# Altium footprint library Selex_PCBLib.PcbLib: 388 footprints (part 8 of 25)
Each footprint in its own frame and in the unit in brackets; x right, y up, seen from the top. Pads: shape width x height; smd on the part's side, far side on the other; paste and mask are expansions set on the pad; w line width, h text height; cw(c..) or ccw(c..) is an arc to the next point about the centre after c.
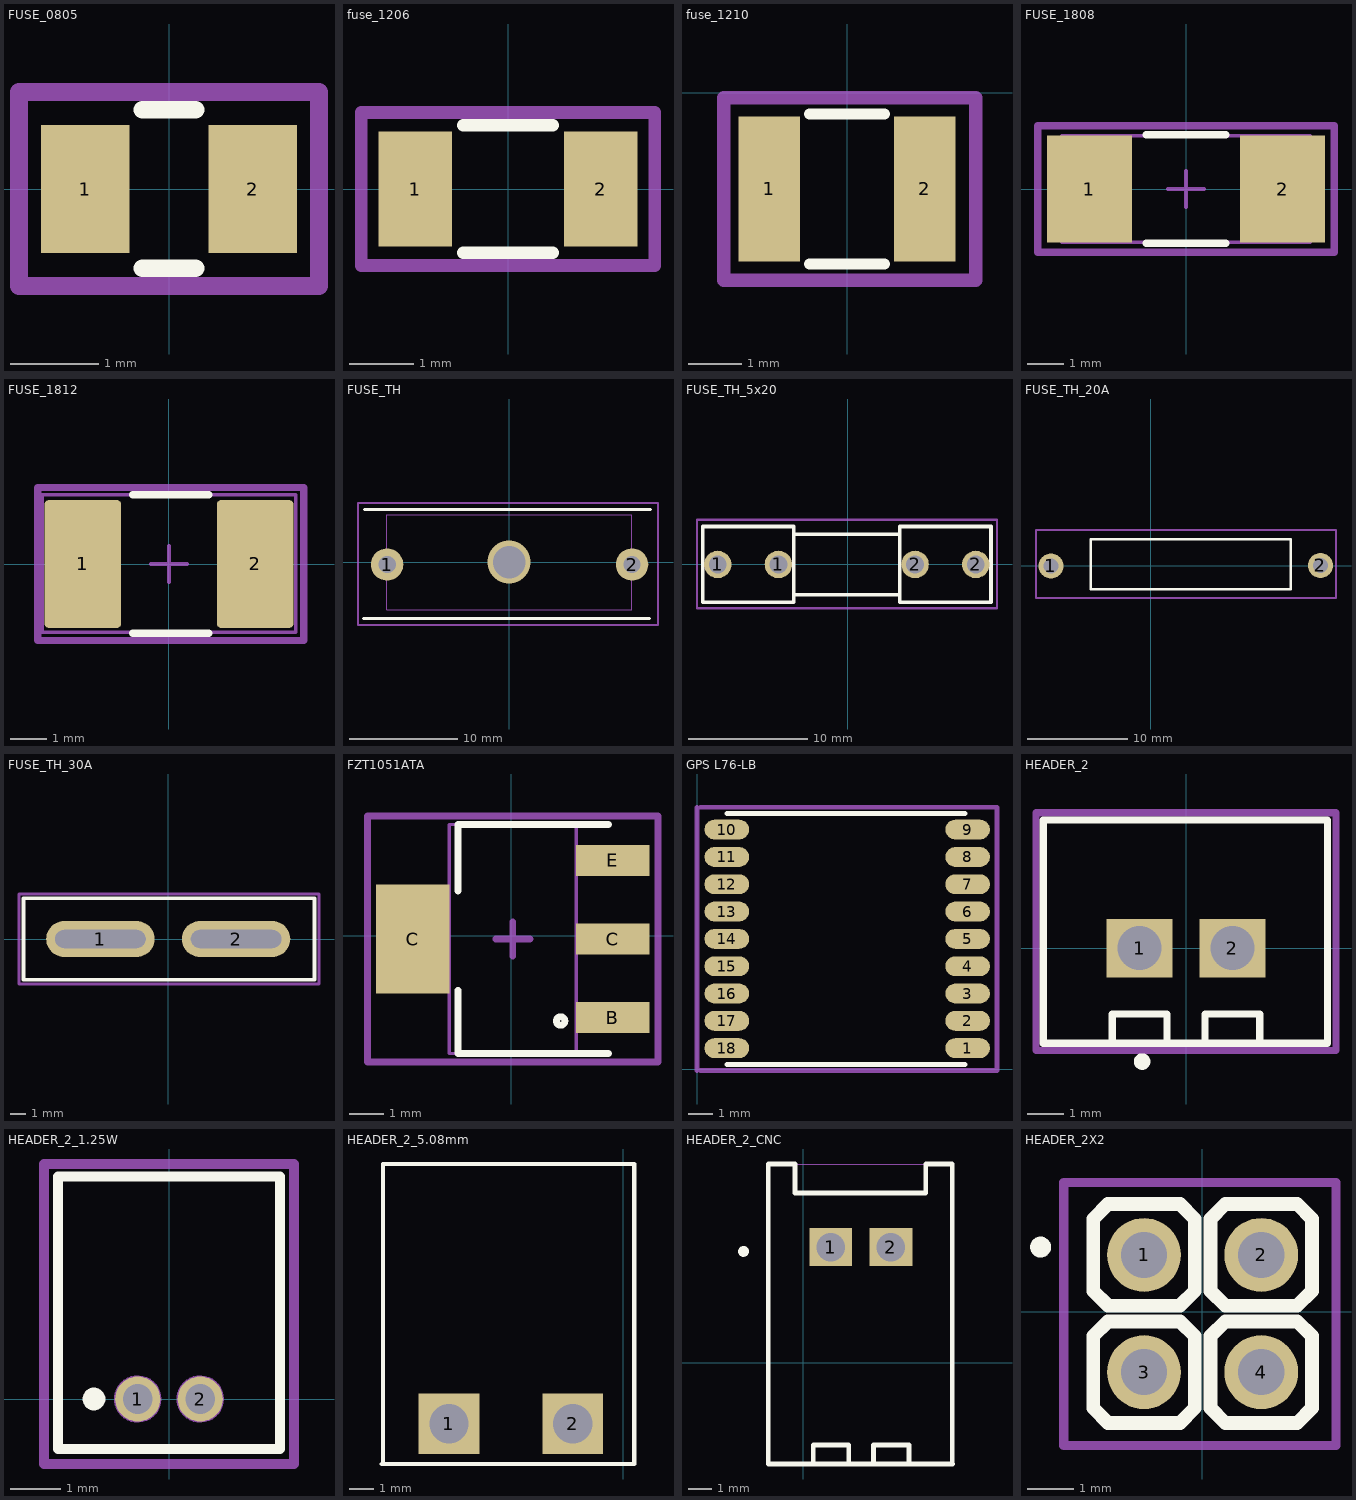
[diagram p7: the footprints below, top view; thin cyan lines are the x and y axes]

## FUSE_0805 [mm]
pads (2):
  rect 1x1.45 smd: 1(-0.95,0) 2(0.95,0)
Top Overlay:
  lines w0.2: -0.3,-0.9 0.3,-0.9 ; -0.3,0.9 0.3,0.9
Mechanical 15:
  lines w0.2: -1.7,-1.1 -1.7,1.1 1.7,1.1 1.7,-1.1 -1.7,-1.1
3D body "fuse_silicon_0805L.step": height 0.5, standoff 0, extent -1.1,-0.77 1.1,0.77

## fuse_1206 [mm]
pads (2):
  rect 1.15x1.8 smd: 1(-1.45,0) 2(1.45,0)
Top Overlay:
  lines w0.2: -0.7,-1 0.7,-1 ; -0.7,1 0.7,1
Mechanical 15:
  lines w0.2: -2.3,-1.2 2.3,-1.2 2.3,1.2 -2.3,1.2 -2.3,-1.2
3D body "fuse_silicon_1206L.step": height 0.5, standoff 0, extent -1.75,-0.92 1.75,0.92

## fuse_1210 [mm]
pads (2):
  rect 1.15x2.7 smd: 1(-1.45,-1.8) 2(1.45,-1.8)
Top Overlay:
  lines w0.2: -0.7,-3.2 -0.35,-3.2 0.35,-3.2 0.7,-3.2 ; -0.7,-0.4 -0.35,-0.4 0.35,-0.4 0.7,-0.4
Mechanical 15:
  lines w0.254: -2.3,-3.5 2.4,-3.5 2.4,-0.1 -2.3,-0.1 -2.3,-3.5
3D body "fuse_silicon_1206L.step": height 0.5, standoff 0, extent -1.75,-2.72 1.75,-0.88
3D body "User Library-0ZCH0010FF2E.STEP": height 0.71, standoff 0.01, extent -1.7,-3.1 1.7,-0.5

## FUSE_1808 [mm]
pads (2):
  rect 2.35x2.95 smd: 1(-2.675,0) 2(2.675,0)
Top Overlay:
  lines w0.2: -1.1,-1.5 1.1,-1.5 ; -1.1,1.5 1.1,1.5
Mechanical 13:
  lines w0.1: -3.43,-1.47 3.43,-1.47 3.43,1.47 -3.43,1.47 -3.43,-1.47
Mechanical 15:
  lines w0.1: -0.5,0 0.5,0 ; 0,-0.5 0,0.5
  lines w0.2: -4.1,-1.75 4.1,-1.75 4.1,1.75 -4.1,1.75 -4.1,-1.75
3D body: height 0.8, standoff 0, extent 1.47,-1.47 3.43,1.47
3D body: height 0.8, standoff 0, extent -3.43,-1.47 -1.47,1.47
3D body: height 0.8, standoff 0, extent -1.47,-1.47 1.47,1.47

## FUSE_1812 [mm]
pads (2):
  rrect10% 2.1x3.5 smd: 1(-2.365,0) 2(2.365,0)
Top Overlay:
  lines w0.2: -1,-1.9 1.1,-1.9 ; -1,1.9 1.1,1.9
Mechanical 13:
  lines w0.1: -3.475,-1.875 -3.475,1.9 3.475,1.9 3.475,-1.875 -3.475,-1.875
Mechanical 15:
  lines w0.1: -0.5,0 0.5,0 ; 0,-0.5 0,0.5
  lines w0.2: -3.6,-2.1 -3.6,2.1 3.7,2.1 3.7,-2.1 -3.6,-2.1
3D body "User Library-1812L.step": height 1.34, standoff 0, extent -2.365,-1.705 2.365,1.705

## FUSE_TH [mm]
pads (2):
  round 3 hole 1.6 mask+0.1: 1(-11.3,-0.2) 2(11.4,-0.2)
via 0,0.02 diameter 4 hole 3
Top Overlay:
  lines w0.3: -13.5,-5.2 13,-5.2 ; -13.4,4.9 13.1,4.9
Mechanical 1:
  lines w0.05: -11.35,-4.38 11.35,-4.38 11.35,4.42 -11.35,4.42 -11.35,-4.38
Mechanical 15:
  lines w0.2: -14,-5.8 -14,5.5 13.8,5.5 13.8,-5.8 -2.4,-5.8 -14,-5.8
3D body "696107003002.STEP": height 14, standoff -3, extent -12.2,-4.88 12.2,4.52

## FUSE_TH_5x20 [mm]
pads (4):
  round 2.3 hole 1.5 mask+0.1: 1(-10.865,-0.04) 1(-5.785,-0.04) 2(5.645,-0.04) 2(10.725,-0.04)
Top Overlay:
  lines w0.3: -4.515,-2.58 4.375,-2.58 ; -4.515,2.5 4.375,2.5 ; -12.135,-3.215 -12.135,3.135 -4.515,3.135 -4.515,-3.215 -12.135,-3.215 ; 4.375,-3.215 11.995,-3.215 11.995,3.135 4.375,3.135 4.375,-3.215
Mechanical 1:
  circle w0.05: c-10.865,-0.04 r1
  circle w0.05: c-5.785,-0.04 r1
  circle w0.05: c5.645,-0.04 r1
  circle w0.05: c10.725,-0.04 r1
  lines w0.05: -4.515,-2.58 4.375,-2.58 ; -4.515,2.5 4.375,2.5 ; -12.135,-3.215 -4.515,-3.215 -4.515,3.135 -12.135,3.135 -12.135,-3.215 ; 4.375,-3.215 4.375,3.135 11.995,3.135 11.995,-3.215 4.375,-3.215
Mechanical 15:
  lines w0.2: -12.6,-3.7 -12.6,3.7 12.5,3.7 12.5,-3.7 -12.6,-3.7
3D body "SW3dPS-Fuse Leg_2009.STEP": height 9.6, standoff -3.3, extent 5.237,-3.11 11.333,3.08
3D body "SW3dPS-Fuse Small 1A.STEP": height 9.41, standoff 4.31, extent -10.02,-2.59 9.68,2.51
3D body "SW3dPS-Fuse Leg_2009.STEP": height 9.6, standoff -3.3, extent -11.263,-3.21 -5.167,2.98

## FUSE_TH_20A [mm]
pads (2):
  round 2.5 hole 1.5 paste+0.1: 1(-10,0) 2(16.942,0.051)
Top Overlay:
  lines w0.254: -6.038,-2.348 -6.038,2.652 13.962,2.652 13.962,-2.348 -6.038,-2.348
Mechanical 15:
  lines w0.2: -11.5,-3.2 -11.5,3.6 18.5,3.6 18.5,-3.2 -11.5,-3.2
3D body "User Library-Fuse 5x20mm 27mm pitch.STEP": height 6.1, standoff -3.7, extent -10.454,-2.923 17.196,3.277

## FUSE_TH_30A [mm]
pads (2):
  oval 7.2x2.4 hole 1.2 slot 6 at 0 deg: 1(-4.5,0) 2(4.5,0)
Top Overlay:
  lines w0.254: -9.6,-2.7 9.7,-2.7 9.7,2.7 -9.6,2.7 -9.6,-2.7
Mechanical 15:
  lines w0.2: -9.9,-3 -9.9,3 10,3 10,-3 -9.9,-3
3D body "User Library-blade fuse - 1 to 40 a - 32 v.STEP": height 14.29, standoff -4.51, extent -9.652,-2.54 9.398,2.54

## FZT1051ATA [mm]
pads (4):
  rect 2.15x0.9 smd: B(2.98,-2.4) C(2.98,-0.1) E(2.98,2.2)
  rect 2.15x3.2 smd: C(-2.88,-0.1)
Top Overlay:
  circle w0.2: c1.45,-2.5 r0.125
  lines w0.2: -1.55,-1.6 -1.55,-3.45 2.855,-3.45 ; -1.55,1.3 -1.55,3.25 2.85,3.25
Mechanical 13:
  lines w0.1: -1.805,-3.45 1.905,-3.45 1.905,3.25 -1.805,3.25 -1.805,-3.45
Mechanical 15:
  lines w0.2: -0.45,-0.1 0.55,-0.1 ; 0.05,-0.6 0.05,0.4 ; -4.2,-3.7 4.3,-3.7 4.3,3.5 -4.2,3.5 -4.2,-3.7
3D body "SOT230P700X180-4N.step": height 1.8, standoff 0, extent -3.55,-3.45 3.45,3.25

## GPS L76-LB [mm]
pads (18):
  rrect100% 1.8x0.8 smd: 1(10.9,0.85) 2(10.9,1.95) 3(10.9,3.05) 4(10.9,4.15) 5(10.9,5.25) 6(10.9,6.35) 7(10.9,7.45) 8(10.9,8.55) 9(10.9,9.65) 10(1.2,9.65) 11(1.2,8.55) 12(1.2,7.45) 13(1.2,6.35) 14(1.2,5.25) 15(1.2,4.15) 16(1.2,3.05) 17(1.2,1.95) 18(1.2,0.85)
Top Overlay:
  lines w0.2: 1.2,0.2 10.8,0.2 ; 1.2,10.3 10.79,10.3
Mechanical 15:
  lines w0.2: 0,-0.06 0,9.99 0,10.54 ; 0.15,-0.05 12.08,-0.05 12.08,10.55 0.15,10.55
3D body "User Library-QUECTEL L76.STEP": height 2.52, standoff 0, extent 1.15,0.1 10.85,10.2

## HEADER_2 [mm] "HEADER_2_2P54"
pads (2):
  rect 1.8x1.6 hole 1.2 mask+0.1: 1(-1.27,0) 2(1.27,0)
Top Overlay:
  circle w0.254: c-1.2,-3.1 r0.1
  lines w0.2: -2.02,-2.5 -2.02,-1.8 -0.52,-1.8 -0.52,-2.5 ; 0.52,-2.5 0.52,-1.8 2.02,-1.8 2.02,-2.5 ; -3.9,-2.596 -3.9,3.504 3.87,3.504 3.87,-2.596 -3.9,-2.596
Mechanical 1:
  circle w0.05: c1.27,0 r0.762
  circle w0.05: c-1.27,0 r0.762
  lines w0.05: -2.02,-2.596 -2.02,-1.8 -0.52,-1.8 -0.52,-2.596 ; 0.52,-2.596 0.52,-1.8 2.02,-1.8 2.02,-2.596 ; -3.91,-2.596 -3.91,3.504 3.87,3.504 3.87,-2.596 -3.91,-2.596
  text "1" at -1.43,-0.4 h0.8
  text "2" at 0.97,-0.4 h0.8
Mechanical 15:
  lines w0.2: -4.1,-2.8 -4.1,3.7 4.1,3.7 4.1,3.1 4.1,-2.8 -4.1,-2.8
3D body "B2B-XH-A-LF--SN---3DModel-STEP-418109.STEP": height 7, standoff -3.4, extent -3.7,-2.45 3.7,3.3

## HEADER_2_1.25W [mm] "HEADER_2_1.25AW"
pads (2):
  round 0.9 hole 0.6 mask+0.05: 1(-0.625,0) 2(0.625,0)
Top Overlay:
  circle w0.254: c-1.5,0 r0.1
  lines w0.2: -2.225,-1 2.225,-1 2.225,4.45 -2.225,4.45 -2.225,-1
Mechanical 1:
  circle w0.05: c-0.625,0 r0.45
  circle w0.05: c0.625,0 r0.45
  lines w0.05: -2.225,-1 -2.225,4.5 2.225,4.5 2.225,-1 -2.225,-1
Mechanical 15:
  lines w0.2: -2.5,-1.3 2.5,-1.3 2.5,4.7 -2.5,4.7 -2.5,-1.3
3D body "31729.stp": height 4.18, standoff -1.72, extent -2.1,-1 2.05,4.4

## HEADER_2_5.08mm [mm]
pads (2):
  rect 2.5x2.5 hole 1.6: 1(-7.15,7.9) 2(-2.07,7.9)
Top Overlay:
  lines w0.167: -9.9,6.25 0.45,6.25 0.45,18.55 -9.85,18.55 -9.85,6.3 -9.9,6.25
3D body "User Library-2EDGR-5_08-02P.STEP": height 9.1, standoff -3.1, extent -9.78,6.4 0.38,18.5

## HEADER_2_CNC [mm]
pads (2):
  rect 1.8x1.6 hole 1.2 mask+0.1: 1(1.155,4.867) 2(3.695,4.867)
Top Overlay:
  circle w0.254: c-2.52,4.686 r0.1
  lines w0.2: -1.464,-4.273 6.306,-4.273 ; 0.416,-4.177 0.416,-3.477 1.916,-3.477 1.916,-4.177 ; 2.956,-4.177 2.956,-3.477 4.456,-3.477 4.456,-4.177 ; -1.475,-4.276 -1.475,8.371 -0.351,8.371 -0.351,7.149 5.159,7.149 5.159,8.371 6.283,8.371 6.283,-4.276 -1.475,-4.276
Mechanical 1:
  circle w0.05: c3.695,4.867 r0.762
  circle w0.05: c1.155,4.867 r0.762
  lines w0.05: -1.485,2.271 -1.485,8.371 6.295,8.371 6.295,2.271 ; -1.474,-4.273 6.306,-4.273 ; 0.416,-4.273 0.416,-3.477 1.916,-3.477 1.916,-4.273 ; 2.956,-4.273 2.956,-3.477 4.456,-3.477 4.456,-4.273
  text "1" at 0.995,4.467 h0.8
  text "2" at 3.395,4.467 h0.8

## HEADER_2X2 [mm] "2X2_2P54"
pads (4):
  round 1.6 hole 1 mask+0.1: 1(-1.26,1.23) 2(1.28,1.23) 3(-1.26,-1.31) 4(1.28,-1.31)
Top Overlay:
  circle w0.254: c-3.5,1.4 r0.1
  lines w0.3: -2.36,-2.09 -2.04,-2.41 -0.48,-2.41 -0.16,-2.09 -0.16,-0.53 -0.48,-0.21 -2.04,-0.21 -2.36,-0.53 -2.36,-2.09 ; -2.36,0.45 -2.04,0.13 -0.48,0.13 -0.16,0.45 -0.16,2.01 -0.48,2.33 -2.04,2.33 -2.36,2.01 -2.36,0.45 ; 0.18,-2.09 0.5,-2.41 2.06,-2.41 2.38,-2.09 2.38,-0.53 2.06,-0.21 0.5,-0.21 0.18,-0.53 0.18,-2.09 ; 0.18,0.45 0.5,0.13 2.06,0.13 2.38,0.45 2.38,2.01 2.06,2.33 0.5,2.33 0.18,2.01 0.18,0.45
Mechanical 1:
  circle w0.05: c1.28,-1.31 r0.762
  circle w0.05: c-1.26,-1.31 r0.762
  circle w0.05: c1.28,1.23 r0.762
  circle w0.05: c-1.26,1.23 r0.762
  lines w0.05: -2.36,-2.09 -2.36,-0.53 -2.04,-0.21 -0.48,-0.21 -0.16,-0.53 -0.16,-2.09 -0.48,-2.41 -2.04,-2.41 -2.36,-2.09 ; -2.36,0.45 -2.36,2.01 -2.04,2.33 -0.48,2.33 -0.16,2.01 -0.16,0.45 -0.48,0.13 -2.04,0.13 -2.36,0.45 ; 0.18,-2.09 0.18,-0.53 0.5,-0.21 2.06,-0.21 2.38,-0.53 2.38,-2.09 2.06,-2.41 0.5,-2.41 0.18,-2.09 ; 0.18,0.45 0.18,2.01 0.5,2.33 2.06,2.33 2.38,2.01 2.38,0.45 2.06,0.13 0.5,0.13 0.18,0.45
  text "1" at -1.39,0.86 h0.8
  text "2" at 1.06,0.86 h0.8
  text "3" at -1.49,-1.69 h0.8
  text "4" at 1.01,-1.69 h0.8
Mechanical 15:
  lines w0.2: -3,-2.9 2.9,-2.9 2.9,2.8 -3,2.8 -3,-2.9
3D body "HEADER1.step": height 5.94, standoff -2.94, extent -0.02,-2.61 2.52,-0.07
3D body "HEADER1.step": height 5.94, standoff -2.94, extent -2.56,-2.61 -0.02,-0.07
3D body "HEADER1.step": height 5.94, standoff -2.94, extent -0.02,-0.07 2.52,2.47
3D body "HEADER1.step": height 5.94, standoff -2.94, extent -2.56,-0.07 -0.02,2.47